# Altium footprint library STM32F407.PcbLib: 54 footprints (part 1 of 4)
Each footprint in its own frame and in the unit in brackets; x right, y up, seen from the top. Pads: shape width x height; smd on the part's side, far side on the other; paste and mask are expansions set on the pad; w line width, h text height; cw(c..) or ccw(c..) is an arc to the next point about the centre after c.
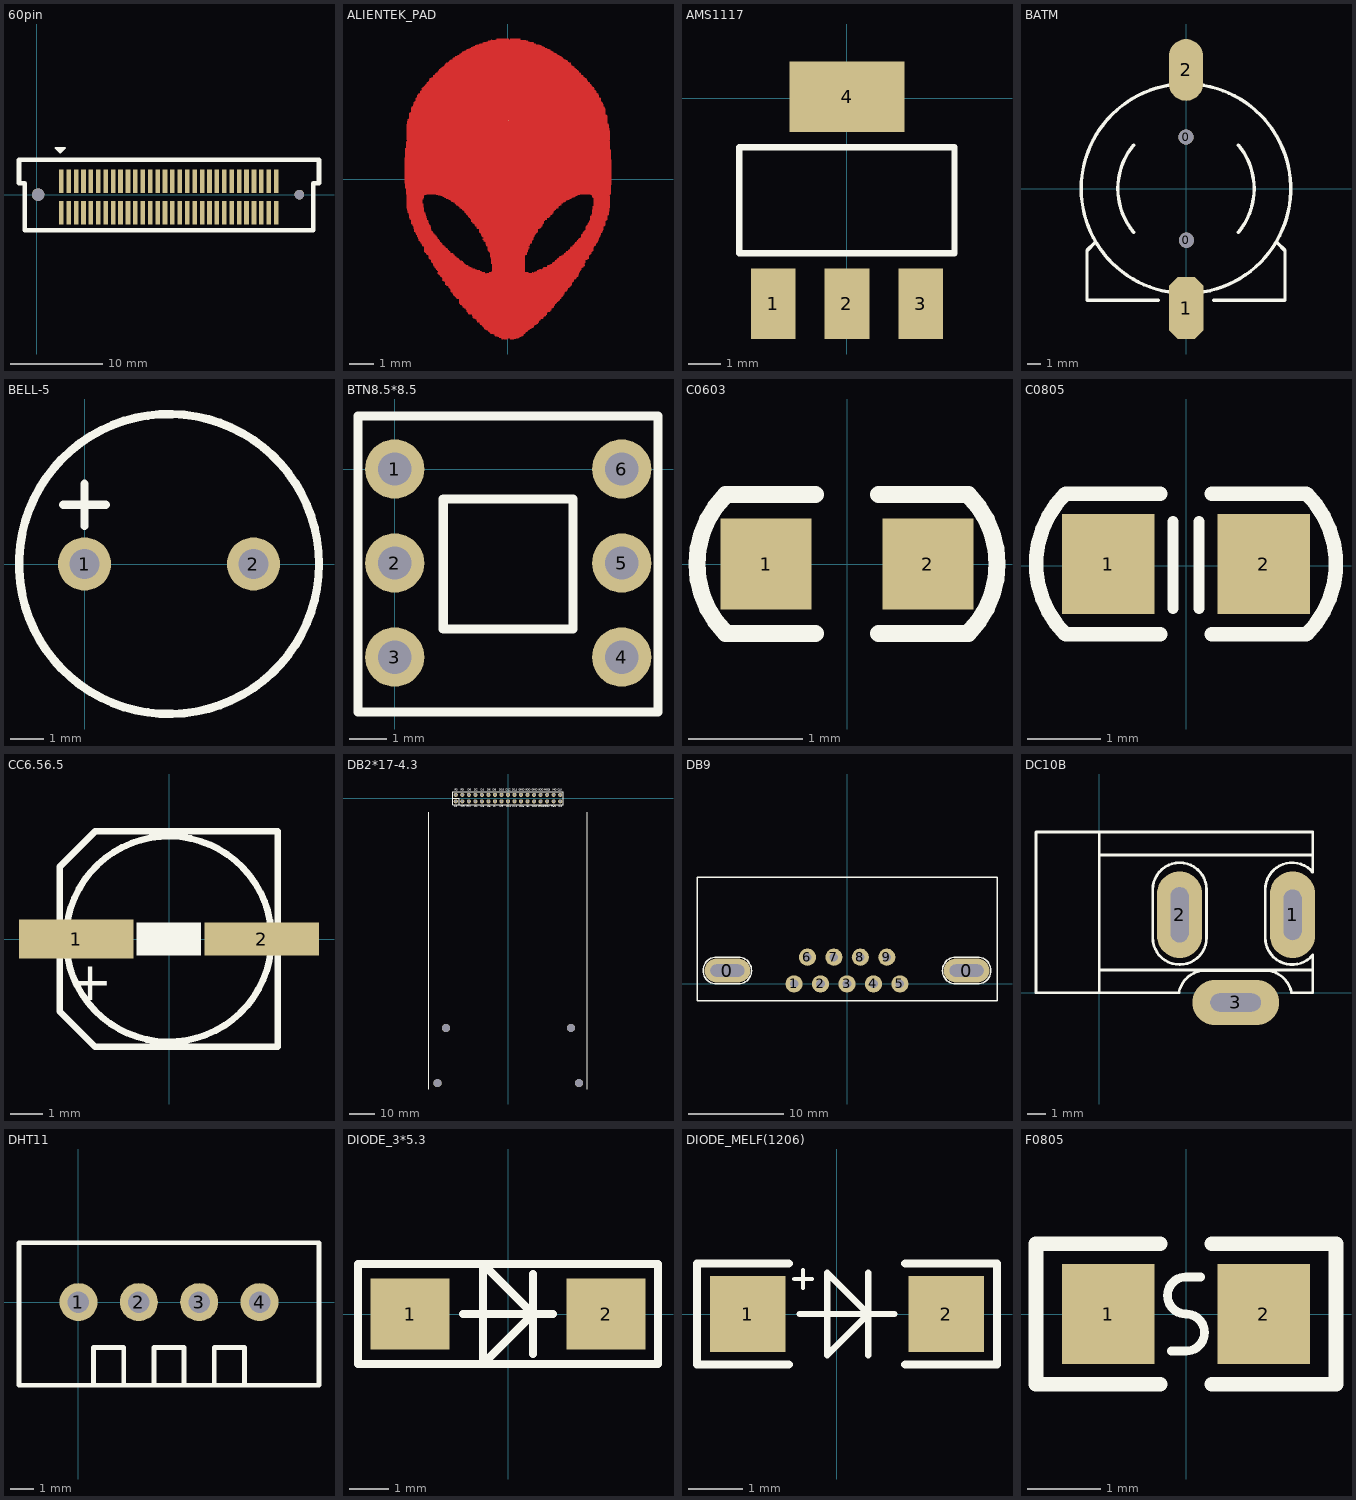
[diagram p0: the footprints below, top view; thin cyan lines are the x and y axes]

## 60pin [mm]
pads (62):
  rect 0.5x2.54 smd: 1(2.657,1.473) 2(3.457,1.473) 3(4.257,1.473) 4(5.057,1.473) 5(5.857,1.473) 6(6.657,1.473) 7(7.457,1.473) 8(8.257,1.473) 9(9.057,1.473) 10(9.857,1.473) 11(10.657,1.473) 12(11.457,1.473) 13(12.257,1.473) 14(13.057,1.473) 15(13.857,1.473) 16(14.657,1.473) 17(15.457,1.473) 18(16.257,1.473) 19(17.057,1.473) 20(17.857,1.473) 21(18.657,1.473) 22(19.457,1.473) 23(20.257,1.473) 24(21.057,1.473) 25(21.857,1.473) 26(22.657,1.473) 27(23.457,1.473) 28(24.257,1.473) 29(25.057,1.473) 30(25.857,1.473) 31(25.857,-1.904) 32(25.057,-1.904) 33(24.257,-1.904) 34(23.457,-1.904) 35(22.657,-1.904) 36(21.857,-1.904) 37(21.057,-1.904) 38(20.257,-1.904) 39(19.457,-1.904) 40(18.657,-1.904) 41(17.857,-1.904) 42(17.057,-1.904) 43(16.257,-1.904) 44(15.457,-1.904) 45(14.657,-1.904) 46(13.857,-1.904) 47(13.057,-1.904) 48(12.257,-1.904) 49(11.457,-1.904) 50(10.657,-1.904) 51(9.857,-1.904) 52(9.057,-1.904) 53(8.257,-1.904) 54(7.457,-1.904) 55(6.657,-1.904) 56(5.857,-1.904) 57(5.057,-1.904) 58(4.257,-1.904) 59(3.457,-1.904) 60(2.657,-1.904)
  round 1.35 hole 1.35: ""(0.157,0.026)
  round 1.05 hole 1.05: ""(28.357,0.026)
Top Overlay:
  lines w0.2: 2.007,5.08 2.54,4.547 3.073,5.08 2.007,5.08
  lines w0.254: 2.68,4.788 2.451,4.788 2.299,4.94 2.807,4.94
  lines w0.5: -1.905,1.27 -1.27,1.27 -1.27,-3.81 29.845,-3.81 29.845,1.27 30.48,1.27 30.48,3.81 27.305,3.81 1.27,3.81 -1.905,3.81 -1.905,1.27

## ALIENTEK_PAD [mil]
pads (1):
  round 1 smd: 1(2,93.76)
Top Layer:
  lines w1.03: -163.73,-5.12 165.18,-5.12 ; -163.73,-4.09 165.18,-4.09 ; -163.73,-3.06 165.18,-3.06 ; -163.73,-2.03 165.18,-2.03 ; -163.73,-1 165.18,-1 ; -163.73,0.03 165.18,0.03 ; -163.73,1.06 165.18,1.06 ; -163.73,2.09 165.18,2.09 ; -163.73,3.12 165.18,3.12 ; -163.73,4.15 165.18,4.15 ; -163.73,5.18 165.18,5.18 ; -163.73,6.21 165.18,6.21 ; -163.73,7.24 165.18,7.24 ; -163.73,8.27 165.18,8.27 ; -163.73,9.3 165.18,9.3 ; -163.73,10.33 165.18,10.33 ; -163.73,11.36 165.18,11.36 ; -163.73,12.39 165.18,12.39 ; -163.73,13.42 165.18,13.42 ; -163.73,14.45 165.18,14.45 ; -163.73,15.48 165.18,15.48 ; -163.73,16.51 165.18,16.51 ; -163.73,17.54 165.18,17.54 ; -163.73,18.57 165.18,18.57 ; -163.73,19.6 165.18,19.6 ; -163.73,20.63 165.18,20.63 ; -163.73,21.66 165.18,21.66 ; -163.73,22.69 165.18,22.69 ; -163.73,23.72 165.18,23.72 ; -163.73,24.75 165.18,24.75 ; -163.73,25.78 165.18,25.78 ; -163.73,26.81 165.18,26.81 ; -163.73,27.84 165.18,27.84 ; -163.73,28.87 165.18,28.87 ; -163.73,29.9 165.18,29.9 ; -163.73,30.93 165.18,30.93 ; -163.73,31.96 164.15,31.96 ; -163.73,32.99 164.15,32.99 ; -163.73,34.02 164.15,34.02 ; -162.7,-13.36 164.15,-13.36 ; -162.7,-12.33 164.15,-12.33 ; -162.7,-11.3 164.15,-11.3 ; -162.7,-10.27 164.15,-10.27 ; -162.7,-9.24 164.15,-9.24 ; -162.7,-8.21 165.18,-8.21 ; -162.7,-7.18 165.18,-7.18 ; -162.7,-6.15 165.18,-6.15 ; -162.7,35.05 164.15,35.05 ; -162.7,36.08 164.15,36.08 ; -162.7,37.11 164.15,37.11 ; -162.7,38.14 164.15,38.14 ; -162.7,39.17 164.15,39.17 ; -162.7,40.2 164.15,40.2 ; -162.7,41.23 164.15,41.23 ; -162.7,42.26 164.15,42.26 ; -162.7,43.29 164.15,43.29 ; -162.7,44.32 164.15,44.32 ; -162.7,45.35 164.15,45.35 ; -162.7,46.38 164.15,46.38 ; -162.7,47.41 164.15,47.41 ; -162.7,48.44 163.12,48.44 ; -162.7,49.47 163.12,49.47 ; -161.67,-22.63 164.15,-22.63 ; -161.67,-21.6 164.15,-21.6 ; -161.67,-20.57 164.15,-20.57 ; -161.67,-19.54 164.15,-19.54 ; -161.67,-18.51 164.15,-18.51 ; -161.67,-17.48 164.15,-17.48 ; -161.67,-16.45 164.15,-16.45 ; -161.67,-15.42 164.15,-15.42 ; -161.67,-14.39 164.15,-14.39 ; -161.67,50.5 163.12,50.5 ; -161.67,51.53 163.12,51.53 ; -161.67,52.56 163.12,52.56 ; -161.67,53.59 163.12,53.59 ; -161.67,54.62 163.12,54.62 ; -161.67,55.65 163.12,55.65 ; -161.67,56.68 163.12,56.68 ; -161.67,57.71 163.12,57.71 ; -161.67,58.74 163.12,58.74 ; -161.67,59.77 163.12,59.77 ; -160.64,-45.29 -133.52,-45.29 ; -160.64,-44.26 -134.55,-44.26 ; -160.64,-43.23 -134.55,-43.23 ; -160.64,-42.2 -134.55,-42.2 ; -160.64,-41.17 -134.55,-41.17 ; -160.64,-40.14 -134.55,-40.14 ; -160.64,-39.11 -134.55,-39.11 ; -160.64,-38.08 -135.58,-38.08 ; -160.64,-37.05 -135.58,-37.05 ; -160.64,-36.02 -135.58,-36.02 ; -160.64,-34.99 -135.58,-34.99 ; -160.64,-33.96 -135.58,-33.96 ; -160.64,-32.93 -135.58,-32.93 ; -160.64,-31.9 -135.58,-31.9 ; -160.64,-30.87 -134.55,-30.87 ; -160.64,-29.84 -134.55,-29.84 ; -160.64,-28.81 -133.52,-28.81 ; -160.64,-27.78 -133.52,-27.78 ; -160.64,-26.75 -133.52,-26.75 ; -160.64,-25.72 -133.52,-25.72 ; -160.64,-24.69 -132.49,-24.69 ; -160.64,-23.66 -129.4,-23.66 ; -160.64,60.8 163.12,60.8 ; -160.64,63.89 163.12,63.89 ; -160.64,64.92 163.12,64.92 ; -160.64,65.95 163.12,65.95 ; -160.64,66.98 163.12,66.98 ; -160.64,68.01 163.12,68.01 ; -160.64,69.04 163.12,69.04 ; -160.64,70.07 163.12,70.07 ; -160.64,71.1 163.12,71.1 ; -160.64,72.13 163.12,72.13 ; -160.64,73.16 163.12,73.16 ; -160.64,74.19 163.12,74.19 ; -160.64,75.22 163.12,75.22 ; -160.64,76.25 163.12,76.25 ; -160.64,77.28 163.12,77.28 ; -160.64,78.31 162.09,78.31 ; -160.64,79.34 2,79.34 162.09,79.34 ; -160.64,80.37 2,80.37 162.09,80.37 ; -160.64,81.4 2,81.4 162.09,81.4 ; -160.64,82.43 2,82.43 161.06,82.43 ; -160.64,83.46 2,83.46 161.06,83.46 ; -160.64,84.49 2,84.49 161.06,84.49 ; -160.64,85.52 2,85.52 161.06,85.52 ; -160.64,86.55 2,86.55 161.06,86.55 ; -160.64,87.58 2,87.58 160.03,87.58 ; -159.61,-48.38 -133.52,-48.38 ; -159.61,-47.35 -133.52,-47.35 ; -159.61,-46.32 -133.52,-46.32 ; -159.61,61.83 162.09,61.83 ; -159.61,62.86 163.12,62.86 ; -159.61,88.61 2,88.61 160.03,88.61 ; -159.61,89.64 2,89.64 159,89.64 ; -159.61,90.67 2,90.67 159,90.67 ; -159.61,91.7 2,91.7 159,91.7 ; -159.61,92.73 2,92.73 159,92.73 ; -158.58,-52.5 -132.49,-52.5 ; -158.58,-51.47 -132.49,-51.47 ; -158.58,-50.44 -133.52,-50.44 ; -158.58,-49.41 -133.52,-49.41 ; -158.58,93.76 2,93.76 159,93.76 ; -158.58,94.79 2,94.79 159,94.79 ; -158.58,95.82 2,95.82 159,95.82 ; -157.55,-54.56 -131.46,-54.56 ; -157.55,-53.53 -131.46,-53.53 ; -157.55,96.85 2,96.85 159,96.85 ; -156.52,-60.74 -129.4,-60.74 ; -156.52,-59.71 -129.4,-59.71 ; -156.52,-58.68 -129.4,-58.68 ; -156.52,-57.65 -130.43,-57.65 ; -156.52,-56.62 -130.43,-56.62 ; -156.52,-55.59 -131.46,-55.59 ; -156.52,97.88 2,97.88 159,97.88 ; -156.52,98.91 2,98.91 159,98.91 ; -156.52,99.94 2,99.94 159,99.94 ; -156.52,100.97 2,100.97 159,100.97 ; -156.52,102 2,102 157.97,102 ; -156.52,103.03 2,103.03 156.94,103.03 ; -156.52,104.06 2,104.06 155.91,104.06 ; -156.52,105.09 2,105.09 155.91,105.09 ; -155.49,-62.8 -128.37,-62.8 ; -155.49,-61.77 -128.37,-61.77 ; -155.49,106.12 2,106.12 155.91,106.12 ; -154.46,-63.83 -128.37,-63.83 ; -154.46,107.15 2,107.15 155.91,107.15 ; -153.43,-70.01 -125.28,-70.01 ; -153.43,-68.98 -126.31,-68.98 ; -153.43,-67.95 -126.31,-67.95 ; -153.43,-66.92 -126.31,-66.92 ; -153.43,-65.89 -126.31,-65.89 ; -153.43,-64.86 -127.34,-64.86 ; -153.43,108.18 2,108.18 155.91,108.18 ; -153.43,109.21 2,109.21 155.91,109.21 ; -153.43,110.24 2,110.24 155.91,110.24 ; -153.43,111.27 2,111.27 155.91,111.27 ; -153.43,112.3 2,112.3 155.91,112.3 ; -153.43,113.33 2,113.33 154.88,113.33 ; -153.43,114.36 2,114.36 154.88,114.36 ; -152.4,-71.04 -125.28,-71.04 ; -152.4,115.39 2,115.39 153.85,115.39 ; -151.37,-73.1 -123.22,-73.1 ; -151.37,-72.07 -124.25,-72.07 ; -151.37,116.42 2,116.42 152.82,116.42 ; -150.34,-74.13 -123.22,-74.13 ; -150.34,117.45 2,117.45 152.82,117.45 ; -150.34,118.48 2,118.48 152.82,118.48 ; -149.31,-78.25 -122.19,-78.25 ; -149.31,-77.22 -123.22,-77.22 ; -149.31,-76.19 -122.19,-76.19 ; -149.31,-75.16 -122.19,-75.16 ; -149.31,119.51 2,119.51 152.82,119.51 ; -149.31,120.54 2,120.54 151.79,120.54 ; -149.31,121.57 2,121.57 151.79,121.57 ; -149.31,122.6 2,122.6 150.76,122.6 ; -148.28,-82.37 -120.13,-82.37 ; -148.28,-81.34 -121.16,-81.34 ; -148.28,-80.31 -121.16,-80.31 ; -148.28,-79.28 -122.19,-79.28 ; -148.28,123.63 2,123.63 149.73,123.63 ; -147.25,-83.4 -119.1,-83.4 ; -147.25,124.66 2,124.66 148.7,124.66 ; -146.22,-85.46 -118.07,-85.46 ; -146.22,-84.43 -119.1,-84.43 ; -146.22,125.69 2,125.69 148.7,125.69 ; -146.22,126.72 2,126.72 148.7,126.72 ; -146.22,127.75 2,127.75 148.7,127.75 ; -146.22,128.78 2,128.78 148.7,128.78 ; -145.19,-87.52 -117.04,-87.52 ; -145.19,-86.49 -117.04,-86.49 ; -145.19,129.81 2,129.81 147.67,129.81 ; -144.16,-90.61 -113.95,-90.61 ; -144.16,-89.58 -113.95,-89.58 ; -144.16,-88.55 -114.98,-88.55 ; -144.16,130.84 2,130.84 145.61,130.84 ; -144.16,131.87 2,131.87 145.61,131.87 ; -144.16,132.9 2,132.9 145.61,132.9 ; -144.16,133.93 2,133.93 145.61,133.93 ; -143.13,-91.64 -112.92,-91.64 ; -143.13,134.96 2,134.96 144.58,134.96 ; -142.1,-93.7 -111.89,-93.7 ; -142.1,-92.67 -111.89,-92.67 ; -142.1,135.99 2,135.99 144.58,135.99 ; -141.07,-96.79 -108.8,-96.79 ; -141.07,-95.76 -109.83,-95.76 ; -141.07,-94.73 -110.86,-94.73 ; -140.04,-97.82 -107.77,-97.82 ; -140.04,137.02 2,137.02 142.52,137.02 ; -139.01,-98.85 -107.77,-98.85 ; -139.01,138.05 2,138.05 141.49,138.05 ; -139.01,139.08 2,139.08 141.49,139.08 ; -139.01,140.11 2,140.11 141.49,140.11 ; -137.98,-100.91 -105.71,-100.91 ; -137.98,-99.88 -106.74,-99.88 ; -137.98,141.14 2,141.14 140.46,141.14 ; -136.95,-102.97 -103.65,-102.97 ; -136.95,-101.94 -104.68,-101.94 ; -136.95,142.17 2,142.17 139.43,142.17 ; -136.95,144.23 2,144.23 138.4,144.23 ; -136.95,145.26 2,145.26 138.4,145.26 ; -135.92,-105.03 -102.62,-105.03 ; -135.92,-104 -103.65,-104 ; -135.92,143.2 2,143.2 138.4,143.2 ; -134.89,-106.06 -100.56,-106.06 ; -134.89,146.29 2,146.29 137.37,146.29 ; -133.86,147.32 2,147.32 135.31,147.32 ; -132.83,-114.3 -92.32,-114.3 ; -132.83,-113.27 -93.35,-113.27 ; -132.83,-112.24 -95.41,-112.24 ; -132.83,-111.21 -95.41,-111.21 ; -132.83,-110.18 -96.44,-110.18 ; -132.83,-109.15 -98.5,-109.15 ; -132.83,-108.12 -99.53,-108.12 ; -132.83,-107.09 -99.53,-107.09 ; -132.83,148.35 2,148.35 135.31,148.35 ; -131.8,-115.33 -91.29,-115.33 ; -131.8,149.38 2,149.38 134.28,149.38 ; -130.77,-116.36 -91.29,-116.36 ; -130.77,150.41 2,150.41 133.25,150.41 ; -129.74,-117.39 -87.17,-117.39 ; -129.74,151.44 2,151.44 132.22,151.44 ; -128.71,-119.45 -86.14,-119.45 ; -128.71,-118.42 -86.14,-118.42 ; -128.71,152.47 2,152.47 131.19,152.47 ; -128.71,153.5 2,153.5 131.19,153.5 ; -127.68,154.53 2,154.53 130.16,154.53 ; -126.65,-120.48 -85.11,-120.48 ; -126.65,155.56 2,155.56 128.1,155.56 ; -125.62,-124.6 -79.96,-124.6 ; -125.62,-123.57 -82.02,-123.57 ; -125.62,-122.54 -83.05,-122.54 ; -125.62,-121.51 -84.08,-121.51 ; -125.62,156.59 2,156.59 128.1,156.59 ; -124.59,-125.63 -78.93,-125.63 ; -124.59,157.62 2,157.62 127.07,157.62 ; -124.59,158.65 2,158.65 126.04,158.65 ; -123.56,-126.66 -77.9,-126.66 ; -123.56,159.68 2,159.68 126.04,159.68 ; -123.56,160.71 2,160.71 125.01,160.71 ; -122.53,-127.69 -76.87,-127.69 ; -121.5,-130.78 -71.72,-130.78 ; -121.5,-129.75 -72.75,-129.75 ; -121.5,-128.72 -75.84,-128.72 ; -121.5,161.74 2,161.74 122.95,161.74 ; -120.47,-131.81 -70.69,-131.81 ; -119.44,-132.84 -69.66,-132.84 ; -119.44,162.77 2,162.77 121.92,162.77 ; -118.41,-135.93 -66.57,-135.93 ; -118.41,-134.9 -67.6,-134.9 ; -118.41,-133.87 -68.63,-133.87 ; -118.41,163.8 2,163.8 120.89,163.8 ; -118.41,164.83 2,164.83 120.89,164.83 ; -118.41,165.86 2,165.86 119.86,165.86 ; -117.38,-137.99 -62.45,-137.99 ; -117.38,-136.96 -63.48,-136.96 ; -116.35,-140.05 -58.33,-140.05 ; -116.35,-139.02 -60.39,-139.02 ; -116.35,166.89 2,166.89 117.8,166.89 ; -115.32,-141.08 -56.27,-141.08 ; -115.32,167.92 2,167.92 116.77,167.92 ; -114.29,168.95 2,168.95 116.77,168.95 ; -113.26,-143.14 -51.12,-143.14 ; -113.26,-142.11 -52.15,-142.11 ; -113.26,-23.66 114.71,-23.66 ; -113.26,169.98 2,169.98 115.74,169.98 ; -112.23,-145.2 -43.91,-145.2 ; -112.23,-144.17 -49.06,-144.17 ; -111.2,-149.32 -35.67,-149.32 ; -111.2,-148.29 -36.7,-148.29 ; -111.2,171.01 2,171.01 113.68,171.01 ; -110.17,-150.35 113.68,-150.35 ; -110.17,-147.26 -40.82,-147.26 ; -110.17,-146.23 -41.85,-146.23 ; -110.17,-24.69 111.62,-24.69 ; -110.17,172.04 2,172.04 113.68,172.04 ; -110.17,173.07 2,173.07 112.65,173.07 ; -109.14,-151.38 112.65,-151.38 ; -109.14,174.1 2,174.1 111.62,174.1 ; -109.14,175.13 2,175.13 110.59,175.13 ; -108.11,-152.41 112.65,-152.41 ; -107.08,-153.44 112.65,-153.44 ; -107.08,176.16 2,176.16 108.53,176.16 ; -106.05,-154.47 111.62,-154.47 ; -106.05,-25.72 110.59,-25.72 ; -106.05,177.19 2,177.19 107.5,177.19 ; -105.02,-155.5 110.59,-155.5 ; -105.02,178.22 2,178.22 106.47,178.22 ; -103.99,-159.62 105.44,-159.62 ; -103.99,-156.53 109.56,-156.53 ; -102.96,-160.65 105.44,-160.65 ; -102.96,-158.59 107.5,-158.59 ; -102.96,-157.56 108.53,-157.56 ; -102.96,-26.75 107.5,-26.75 ; -102.96,179.25 2,179.25 106.47,179.25 ; -101.93,-161.68 105.44,-161.68 ; -101.93,180.28 2,180.28 104.41,180.28 ; -100.9,-27.78 106.47,-27.78 ; -100.9,181.31 2,181.31 103.38,181.31 ; -99.87,-162.71 104.41,-162.71 ; -99.87,-28.81 103.38,-28.81 ; -99.87,182.34 2,182.34 101.32,182.34 ; -98.84,-166.83 102.35,-166.83 ; -98.84,-165.8 102.35,-165.8 ; -98.84,-164.77 102.35,-164.77 ; -98.84,-163.74 103.38,-163.74 ; -98.84,183.37 2,183.37 100.29,183.37 ; -98.84,184.4 2,184.4 100.29,184.4 ; -97.81,-167.86 101.32,-167.86 ; -97.81,-29.84 101.32,-29.84 ; -97.81,185.43 2,185.43 100.29,185.43 ; -96.78,-168.89 101.32,-168.89 ; -94.72,-169.92 100.29,-169.92 ; -94.72,-30.87 99.26,-30.87 ; -94.72,186.46 2,186.46 97.2,186.46 ; -93.69,-171.98 97.2,-171.98 ; -93.69,-170.95 99.26,-170.95 ; -93.69,187.49 2,187.49 96.17,187.49 ; -92.66,-173.01 96.17,-173.01 ; -92.66,-31.9 97.2,-31.9 ; -92.66,188.52 2,188.52 96.17,188.52 ; -91.63,-174.04 96.17,-174.04 ; -91.63,-32.93 95.14,-32.93 ; -91.63,189.55 2,189.55 94.11,189.55 ; -90.6,-178.16 92.05,-178.16 ; -90.6,-177.13 94.11,-177.13 ; -90.6,-176.1 95.14,-176.1 ; -90.6,-175.07 95.14,-175.07 ; -90.6,190.58 2,190.58 93.08,190.58 ; -89.57,-179.19 91.02,-179.19 ; -89.57,-33.96 93.08,-33.96 ; -88.54,-34.99 92.05,-34.99 ; -87.51,-181.25 89.99,-181.25 ; -87.51,-180.22 89.99,-180.22 ; -87.51,191.61 2,191.61 89.99,191.61 ; -87.51,192.64 2,192.64 88.96,192.64 ; -86.48,-183.31 88.96,-183.31 ; -86.48,-182.28 89.99,-182.28 ; -86.48,-36.02 89.99,-36.02 ; -86.48,193.67 2,193.67 87.93,193.67 ; -85.45,-184.34 88.96,-184.34 ; -84.42,-185.37 87.93,-185.37 ; -84.42,-37.05 87.93,-37.05 ; -84.42,194.7 -1,194.7 -0.7,194.7 2,194.7 86.9,194.7 ; -83.39,-186.4 86.9,-186.4 ; -83.39,-38.08 85.87,-38.08 ; -83.39,195.73 -1,195.73 -0.7,195.73 2,195.73 85.87,195.73 ; -82.36,-187.43 85.87,-187.43 ; -82.36,-39.11 85.87,-39.11 ; -81.33,-188.46 85.87,-188.46 ; -81.33,-40.14 85.87,-40.14 ; -80.3,-189.49 84.84,-189.49 ; -80.3,196.76 -1,196.76 -0.7,196.76 2,196.76 82.78,196.76 ; -79.27,-41.17 82.78,-41.17 ; -79.27,197.79 -1,197.79 -0.7,197.79 2,197.79 81.75,197.79 ; -78.24,-42.2 81.75,-42.2 ; -77.21,-196.7 77.63,-196.7 ; -77.21,-195.67 78.66,-195.67 ; -77.21,-194.64 79.69,-194.64 ; -77.21,-193.61 80.72,-193.61 ; -77.21,-191.55 82.78,-191.55 ; -77.21,-190.52 82.78,-190.52 ; -77.21,-43.23 80.72,-43.23 ; -77.21,198.82 -1,198.82 -0.7,198.82 2,198.82 79.69,198.82 ; -76.18,-197.73 76.6,-197.73 ; -76.18,-192.58 81.75,-192.58 ; -76.18,-45.29 80.72,-45.29 ; -76.18,-44.26 80.72,-44.26 ; -76.18,199.85 -1,199.85 -0.7,199.85 2,199.85 78.66,199.85 ; -75.15,-198.76 75.57,-198.76 ; -74.12,-46.32 77.63,-46.32 ; -74.12,200.88 -1,200.88 -0.7,200.88 2,200.88 76.6,200.88 ; -73.09,-199.79 75.57,-199.79 ; -73.09,201.91 -1,201.91 -0.7,201.91 2,201.91 74.54,201.91 ; -72.06,-200.82 74.54,-200.82 ; -72.06,-47.35 76.6,-47.35 ; -72.06,202.94 -1,202.94 -0.7,202.94 2,202.94 72.48,202.94 ; -71.03,-202.88 73.51,-202.88 ; -71.03,-201.85 73.51,-201.85 ; -71.03,-48.38 75.57,-48.38 ; -70,-203.91 72.48,-203.91 ; -70,-49.41 74.54,-49.41 ; -70,203.97 -1,203.97 -0.7,203.97 2,203.97 71.45,203.97 ; -68.97,-204.94 71.45,-204.94 ; -68.97,-50.44 73.51,-50.44 ; -67.94,-52.5 72.48,-52.5 ; -67.94,-51.47 72.48,-51.47 ; -67.94,205 -1,205 -0.7,205 2,205 69.39,205 ; -66.91,-205.97 69.39,-205.97 ; -66.91,-53.53 72.48,-53.53 ; -65.88,-207 68.36,-207 ; -65.88,-54.56 71.45,-54.56 ; -65.88,206.03 -1,206.03 -0.7,206.03 2,206.03 68.36,206.03 ; -64.85,-210.09 67.33,-210.09 ; -64.85,-209.06 68.36,-209.06 ; -64.85,-208.03 69.39,-208.03 ; -64.85,-55.59 70.42,-55.59 ; -63.82,-211.12 64.24,-211.12 ; -63.82,-56.62 68.36,-56.62 ; -63.82,207.06 -1,207.06 -0.7,207.06 2,207.06 66.3,207.06 ; -62.79,-213.18 62.18,-213.18 ; -62.79,-212.15 62.18,-212.15 ; -62.79,-58.68 67.33,-58.68 ; -62.79,-57.65 68.36,-57.65 ; -61.76,-214.21 62.18,-214.21 ; -61.76,-59.71 66.3,-59.71 ; -61.76,208.09 -1,208.09 -0.7,208.09 2,208.09 63.21,208.09 ; -60.73,-60.74 65.27,-60.74 ; -59.7,-61.77 62.18,-61.77 ; -59.7,209.12 -1,209.12 -0.7,209.12 2,209.12 62.18,209.12 ; -58.67,-62.8 62.18,-62.8 ; -57.64,-66.92 58.06,-66.92 ; -57.64,-65.89 58.06,-65.89 ; -57.64,-64.86 59.09,-64.86 ; -57.64,-63.83 62.18,-63.83 ; -57.64,210.15 -1,210.15 -0.7,210.15 2,210.15 59.09,210.15 ; -56.61,-216.27 61.15,-216.27 ; -56.61,-215.24 62.18,-215.24 ; -56.61,-67.95 58.06,-67.95 ; -55.58,-219.36 57.03,-219.36 ; -55.58,-218.33 58.06,-218.33 ; -55.58,-217.3 60.12,-217.3 ; -55.58,-68.98 58.06,-68.98 ; -55.58,211.18 -1,211.18 -0.7,211.18 2,211.18 58.06,211.18 ; -54.55,-220.39 57.03,-220.39 ; -53.52,-70.01 57.03,-70.01 ; -53.52,212.21 -1,212.21 -0.7,212.21 2,212.21 54.97,212.21 ; -52.49,-221.42 56,-221.42 ; -52.49,-72.07 54.97,-72.07 ; -52.49,-71.04 56,-71.04 ; -51.46,-74.13 54.97,-74.13 ; -51.46,-73.1 54.97,-73.1 ; -51.46,213.24 -1,213.24 -0.7,213.24 2,213.24 53.94,213.24 ; -50.43,-222.45 52.91,-222.45 ; -49.4,-224.51 50.85,-224.51 ; -49.4,-223.48 51.88,-223.48 ; -49.4,-77.22 51.88,-77.22 ; -49.4,-76.19 52.91,-76.19 ; -49.4,-75.16 53.94,-75.16 ; -49.4,214.27 -1,214.27 -0.7,214.27 2,214.27 50.85,214.27 ; -48.37,-226.57 49.82,-226.57 ; -48.37,-225.54 49.82,-225.54 ; -48.37,-78.25 50.85,-78.25 ; -45.28,-83.4 47.76,-83.4 ; -45.28,-82.37 47.76,-82.37 ; -45.28,-81.34 47.76,-81.34 ; -45.28,-80.31 47.76,-80.31 ; -45.28,-79.28 47.76,-79.28 ; -45.28,215.3 -1,215.3 -0.7,215.3 2,215.3 2.63,215.3 44.67,215.3 ; -44.25,-229.66 47.76,-229.66 ; -44.25,-228.63 47.76,-228.63 ; -44.25,-227.6 48.79,-227.6 ; -44.25,-84.43 46.73,-84.43 ; -44.25,216.33 -1,216.33 -0.7,216.33 2,216.33 2.63,216.33 44.67,216.33 ; -43.22,-230.69 45.7,-230.69 ; -43.22,-85.46 45.7,-85.46 ; -42.19,-88.55 43.64,-88.55 ; -42.19,-87.52 43.64,-87.52 ; -42.19,-86.49 44.67,-86.49 ; -41.16,-231.72 43.64,-231.72 ; -41.16,-89.58 42.61,-89.58 ; -40.13,-232.75 41.58,-232.75 ; -40.13,-90.61 42.61,-90.61 ; -39.1,-233.78 41.58,-233.78 ; -39.1,-95.76 40.55,-95.76 ; -39.1,-94.73 40.55,-94.73 ; -39.1,-91.64 41.58,-91.64 ; -39.1,217.36 -1,217.36 -0.7,217.36 2,217.36 2.63,217.36 4.36,217.36 41.58,217.36 ; -38.07,-235.84 40.55,-235.84 ; -38.07,-234.81 40.55,-234.81 ; -38.07,-97.82 38.49,-97.82 ; -38.07,-96.79 39.52,-96.79 ; -38.07,-93.7 40.55,-93.7 ; -38.07,-92.67 40.55,-92.67 ; -38.07,218.39 -1,218.39 -0.7,218.39 2,218.39 2.63,218.39 4.36,218.39 40.55,218.39 ; -37.04,-236.87 37.46,-236.87 ; -36.01,-237.9 35.4,-237.9 ; -36.01,-98.85 38.49,-98.85 ; -34.98,-238.93 34.37,-238.93 ; -34.98,-102.97 35.4,-102.97 ; -34.98,-101.94 36.43,-101.94 ; -34.98,-100.91 38.49,-100.91 ; -34.98,-99.88 38.49,-99.88 ; -33.95,-105.03 34.37,-105.03 ; -33.95,-104 35.4,-104 ; -32.92,-239.96 33.34,-239.96 ; -32.92,-149.32 113.68,-149.32 ; -32.92,-106.06 34.37,-106.06 ; -32.92,219.42 -1,219.42 -0.7,219.42 2,219.42 2.63,219.42 4.36,219.42 19,219.42 34.37,219.42 ; -31.89,-112.24 32.31,-112.24 ; -31.89,-111.21 33.34,-111.21 ; -31.89,-110.18 33.34,-110.18 ; -31.89,-108.12 34.37,-108.12 ; -31.89,-107.09 33.34,-107.09 ; -30.86,-240.99 32.31,-240.99 ; -30.86,-113.27 32.31,-113.27 ; -30.86,-109.15 34.37,-109.15 ; -30.86,220.45 -1,220.45 -0.7,220.45 2,220.45 2.63,220.45 4,220.45 ; -29.83,-242.02 30.25,-242.02 ; -29.83,-114.3 32.31,-114.3 ; -28.8,-243.05 29.22,-243.05 ; -28.8,-148.29 33.34,-148.29 ; -28.8,-115.33 31.28,-115.33 ; -27.77,-244.08 28.19,-244.08 ; -27.77,-122.54 27.16,-122.54 ; -27.77,-121.51 27.16,-121.51 ; -27.77,-120.48 28.19,-120.48 ; -27.77,-119.45 30.25,-119.45 ; -27.77,-118.42 30.25,-118.42 ; -27.77,-117.39 30.25,-117.39 ; -27.77,-116.36 30.25,-116.36 ; -26.74,-245.11 27.16,-245.11 ; -26.74,-124.6 27.16,-124.6 ; -26.74,-123.57 27.16,-123.57 ; -26.74,221.48 -1,221.48 -0.7,221.48 2,221.48 2.63,221.48 4,221.48 4.36,221.48 19,221.48 29.22,221.48 ; -25.71,-147.26 27.16,-147.26 ; -25.71,-133.87 27.16,-133.87 ; -25.71,-132.84 27.16,-132.84 ; -25.71,-131.81 27.16,-131.81 ; -25.71,-130.78 27.16,-130.78 ; -25.71,-129.75 27.16,-129.75 ; -25.71,-128.72 27.16,-128.72 ; -25.71,-127.69 27.16,-127.69 ; -25.71,-126.66 27.16,-126.66 ; -25.71,-125.63 27.16,-125.63 ; -25.71,222.51 -25.37,222.51 ; -24.68,-146.23 27.16,-146.23 ; -24.68,-145.2 27.16,-145.2 ; -24.68,-144.17 27.16,-144.17 ; -24.68,-143.14 27.16,-143.14 ; -24.68,-142.11 27.16,-142.11 ; -24.68,-141.08 27.16,-141.08 ; -24.68,-140.05 27.16,-140.05 ; -24.68,-139.02 27.16,-139.02 ; -24.68,-137.99 27.16,-137.99 ; -24.68,-136.96 27.16,-136.96 ; -24.68,-135.93 27.16,-135.93 ; -24.68,-134.9 27.16,-134.9 ; -21.59,-246.14 26.13,-246.14 ; -20.56,-248.2 25.1,-248.2 ; -20.56,-247.17 25.1,-247.17 ; -19.53,-249.23 23.04,-249.23 ; -18.5,222.51 -1,222.51 -0.7,222.51 2,222.51 2.63,222.51 4,222.51 4.36,222.51 19,222.51 19.95,222.51 ; -17.47,223.54 -11,223.54 -1,223.54 -0.7,223.54 2,223.54 ; -15.41,-250.26 20.98,-250.26 ; -13.35,-251.29 18.92,-251.29 ; -10.26,-252.32 16.86,-252.32 ; -9.23,-254.38 -7.86,-254.38 ; -9.23,-253.35 -0.65,-253.35 ; -6.14,-254.38 -0.65,-254.38 ; 4,223.54 4.36,223.54 19,223.54 19.95,223.54 ; 4.16,-254.38 9.65,-254.38 ; 4.16,-253.35 12.74,-253.35 ; 4.36,220.45 19,220.45 32.31,220.45 ; 39.18,-148.29 40.55,-148.29 ; 42.27,-148.29 113.68,-148.29 ; 43.3,-147.26 114.71,-147.26 ; 46.39,-146.23 114.71,-146.23 ; 47.42,-145.2 115.74,-145.2 ; 49.48,-144.17 116.77,-144.17 ; 51.54,-143.14 52.91,-143.14 ; 54.63,-143.14 117.8,-143.14 ; 55.66,-142.11 117.8,-142.11 ; 56.69,-141.08 117.8,-141.08 ; 57.72,-140.05 118.83,-140.05 ; 62.87,-139.02 120.89,-139.02 ; 62.87,-137.99 121.92,-137.99 ; 63.9,-136.96 122.95,-136.96 ; 66.99,-135.93 122.95,-135.93 ; 69.05,-134.9 121.92,-134.9 ; 71.11,-133.87 121.92,-133.87 ; 72.14,-132.84 122.95,-132.84 ; 72.14,-131.81 123.98,-131.81 ; 75.23,-130.78 123.98,-130.78 ; 76.26,-129.75 123.98,-129.75 ; 76.26,-128.72 123.98,-128.72 ; 78.32,-127.69 126.04,-127.69 ; 79.35,-126.66 128.1,-126.66 ; 80.38,-125.63 129.13,-125.63 ; 81.41,-124.6 129.13,-124.6 ; 82.44,-123.57 129.13,-123.57 ; 83.47,-122.54 129.13,-122.54 ; 85.53,-121.51 129.13,-121.51 ; 87.59,-120.48 130.16,-120.48 ; 90.68,-119.45 131.19,-119.45 ; 90.68,-118.42 132.22,-118.42 ; 90.68,-117.39 133.25,-117.39 ; 92.74,-116.36 133.25,-116.36 ; 93.77,-115.33 133.25,-115.33 ; 93.77,-114.3 135.31,-114.3 ; 96.86,-113.27 136.34,-113.27 ; 97.89,-112.24 136.34,-112.24 ; 98.92,-111.21 136.34,-111.21 ; 99.95,-110.18 136.34,-110.18 ; 99.95,-109.15 136.34,-109.15 ; 100.98,-108.12 136.34,-108.12 ; 100.98,-107.09 137.37,-107.09 ; 104.07,-106.06 138.4,-106.06 ; 104.07,-105.03 139.43,-105.03 ; 105.1,-104 140.46,-104 ; 106.13,-102.97 140.46,-102.97 ; 108.19,-101.94 141.49,-101.94 ; 108.19,-100.91 141.49,-100.91 ; 108.19,-99.88 142.52,-99.88 ; 110.25,-98.85 143.55,-98.85 ; 111.28,-97.82 143.55,-97.82 ; 111.28,-96.79 144.58,-96.79 ; 112.31,-95.76 144.58,-95.76 ; 113.34,-94.73 145.61,-94.73 ; 114.37,-93.7 145.61,-93.7 ; 116.43,-92.67 145.61,-92.67 ; 117.46,-91.64 146.64,-91.64 ; 117.46,-90.61 146.64,-90.61 ; 117.46,-89.58 147.67,-89.58 ; 117.46,-88.55 147.67,-88.55 ; 118.49,-87.52 148.7,-87.52 ; 119.52,-86.49 148.7,-86.49 ; 119.52,-85.46 148.7,-85.46 ; 120.55,-84.43 149.73,-84.43 ; 121.58,-83.4 150.76,-83.4 ; 121.58,-82.37 150.76,-82.37 ; 122.61,-81.34 151.79,-81.34 ; 124.67,-80.31 151.79,-80.31 ; 124.67,-79.28 152.82,-79.28 ; 124.67,-78.25 152.82,-78.25 ; 124.67,-77.22 152.82,-77.22 ; 124.67,-76.19 152.82,-76.19 ; 124.67,-75.16 152.82,-75.16 ; 125.7,-74.13 153.85,-74.13 ; 126.73,-73.1 154.88,-73.1 ; 127.76,-72.07 155.91,-72.07 ; 127.76,-71.04 155.91,-71.04 ; 128.79,-70.01 155.91,-70.01 ; 128.79,-68.98 155.91,-68.98 ; 129.82,-67.95 155.91,-67.95 ; 129.82,-66.92 155.91,-66.92 ; 130.85,-65.89 155.91,-65.89 ; 130.85,-64.86 156.94,-64.86 ; 131.88,-63.83 159,-63.83 ; 131.88,-62.8 159,-62.8 ; 131.88,-61.77 159,-61.77 ; 131.88,-60.74 159,-60.74 ; 131.88,-59.71 159,-59.71 ; 131.88,-58.68 159,-58.68 ; 132.91,-57.65 159,-57.65 ; 132.91,-23.66 163.12,-23.66 ; 133.94,-56.62 160.03,-56.62 ; 133.94,-55.59 161.06,-55.59 ; 133.94,-24.69 163.12,-24.69 ; 134.97,-54.56 161.06,-54.56 ; 134.97,-53.53 161.06,-53.53 ; 134.97,-51.47 161.06,-51.47 ; 134.97,-50.44 162.09,-50.44 ; 134.97,-49.41 162.09,-49.41 ; 134.97,-48.38 162.09,-48.38 ; 134.97,-26.75 163.12,-26.75 ; 134.97,-25.72 162.09,-25.72 ; 136,-52.5 161.06,-52.5 ; 136,-47.35 162.09,-47.35 ; 136,-46.32 162.09,-46.32 ; 136,-45.29 162.09,-45.29 ; 136,-44.26 163.12,-44.26 ; 136,-43.23 163.12,-43.23 ; 136,-28.81 163.12,-28.81 ; 136,-27.78 163.12,-27.78 ; 137.03,-42.2 163.12,-42.2 ; 137.03,-41.17 163.12,-41.17 ; 137.03,-40.14 163.12,-40.14 ; 137.03,-39.11 163.12,-39.11 ; 137.03,-38.08 163.12,-38.08 ; 137.03,-37.05 163.12,-37.05 ; 137.03,-36.02 163.12,-36.02 ; 137.03,-34.99 163.12,-34.99 ; 137.03,-33.96 163.12,-33.96 ; 137.03,-32.93 163.12,-32.93 ; 137.03,-31.9 163.12,-31.9 ; 137.03,-30.87 163.12,-30.87 ; 137.03,-29.84 163.12,-29.84

## AMS1117 [mm]
pads (4):
  rect 1.4x2.2 smd: 1(-2.3,-6.399) 2(0,-6.399) 3(2.3,-6.399)
  rect 3.6x2.2 smd: 4(0,0.052)
Top Overlay:
  lines w0.2: -3.353,-4.826 3.35,-4.826 3.35,-1.524 -3.353,-1.524 -3.353,-4.826
3D body "SW3DPS-SOT-223-DEFAULT.STEP": height 1.65, standoff -0.03, extent -3.251,-6.628 3.249,0.332

## BATM [mm]
pads (4):
  round 1.1 hole 1.1 unplated: 0(0,3.748) 0(0.025,-3.752)
  oct 2.5x4.5 smd: 1(0.025,-8.687)
  oval 2.5x4.5 smd: 2(0,8.636)
Top Overlay:
  lines w0.25: -6.6,-3.902 -7.2,-4.502 -7.2,-8.128 -2,-8.128 ; -3.815,-3.171 cw(c0,-0.002) -3.812,3.171 ; -0.833,-7.576 cw(c0,-0.002) -7.62,-0.002 cw(c0,-0.002) -0.833,7.573 ; 0.833,-7.576 ccw(c0,-0.002) 0.833,7.573 ; 2,-8.128 7.2,-8.128 7.2,-4.502 6.625,-3.927 ; 3.81,-3.177 ccw(c0,-0.002) 3.812,3.171
3D body "User Library-cr1220.STEP": height 4.44, standoff -0.5, extent -7.493,-9.504 7.504,8.996

## BELL-5 [mm]
pads (2):
  round 1.6 hole 0.9: 1(0,0) 2(5.08,0)
Top Overlay:
  circle w0.254: c2.54,0 r4.51
  lines w0.254: -0.635,1.778 0.635,1.778 ; 0,1.143 0,2.413

## BTN8.5*8.5 [mm]
pads (6):
  round 1.6 hole 0.9: 1(0,0) 2(0,-2.54) 3(0,-5.08) 4(6.131,-5.08) 5(6.131,-2.54) 6(6.131,0)
Top Overlay:
  lines w0.25: -0.991,-6.565 -0.991,1.435 7.112,1.435 7.112,-6.565 -0.991,-6.565 ; 1.313,-4.318 4.818,-4.318 4.818,-0.813 1.313,-0.813 1.313,-4.318
3D body "User Library-PSM1-0-0.step": height 13.5, standoff -3.5, extent -0.935,-6.565 7.065,1.435

## C0603 [mm]
pads (2):
  rect 0.8x0.8 smd: 1(-0.711,0) 2(0.711,0)
Top Overlay:
  lines w0.15: -0.279,-0.61 -1.067,-0.61 cw(c-0.457,0) -1.067,0.61 -0.279,0.61 ; 0.279,-0.61 1.067,-0.61 ccw(c0.457,0) 1.067,0.61 0.279,0.61
3D body "0603_C.step": height 0.88, standoff 0, extent -0.8,-0.406 0.8,0.404

## C0805 [mil]
pads (2):
  rect 50x54 smd: 1(-42,1) 2(42,1)
Top Overlay:
  lines w5.91: -7,-23 -7,24 ; 7,-23 7,24
  lines w7.87: -14,-37 -65,-37 cw(c-27.91,1) -65,39 -14,39 ; 14,-37 65,-37 ccw(c27.91,1) 65,39 14,39
3D body "C0805.STEP": height 19.68, standoff 0, extent -39,-24 39.74,25.21

## CC6.56.5 [mm]
pads (2):
  rect 3.5x1.2 smd: 1(-2.845,0)
  rect 3.5x1 smd: 2(2.845,0)
Top Overlay:
  rectangle: -0.997,-0.496 0.987,0.5
  lines w0.2: -3.353,-2.21 -3.353,2.21 -2.254,3.309 3.327,3.309 3.327,-3.305 -2.257,-3.305 -3.353,-2.21
  lines w0.203: 2.924,1.156 ccw(c-0.007,0.002) 2.924,1.154
  text "+" at -1.727,-1.88 h1.2
3D body "SL-E.step": height 5.2, standoff 0, extent -3.5,-3.3 3.5,3.3

## DB2*17-4.3 [mm]
pads (38):
  round 1.6 hole 0.9: 1(-20.322,-1.264) 2(-20.322,1.276) 3(-17.782,-1.264) 4(-17.782,1.276) 5(-15.24,-1.27) 6(-15.242,1.276) 7(-12.7,-1.27) 8(-12.7,1.27) 9(-10.162,-1.264) 10(-10.162,1.276) 11(-7.622,-1.264) 12(-7.622,1.276) 13(-5.082,-1.264) 14(-5.082,1.276) 15(-2.542,-1.264) 16(-2.542,1.276) 17(-0.002,-1.264) 18(-0.002,1.276) 19(2.538,-1.264) 20(2.538,1.276) 21(5.078,-1.264) 22(5.078,1.276) 23(7.618,-1.264) 24(7.618,1.276) 25(10.158,-1.264) 26(10.158,1.276) 27(12.698,-1.264) 28(12.698,1.276) 29(15.238,-1.264) 30(15.238,1.276) 31(17.778,-1.264) 32(17.778,1.276) 33(20.318,-1.264) 34(20.318,1.276)
  round 3.2 hole 3.2: ""(-27.445,-110.866) ""(-24.13,-89.45) ""(24.5,-89.39) ""(27.605,-110.866)
Top Overlay:
  lines w0.203: -21.59,0 -19.05,0 -19.05,-2.5 -19,-2.55 -21.59,-2.55 -21.59,2.55 21.59,2.55 21.59,-2.53 ; -19.11,-2.55 21.59,-2.55
  lines w0.254: -30.861,-113.157 -30.861,-5.588 ; 30.861,-113.157 30.861,-5.588
  text "D14" at 1.703,2.836 h0.71
  text "D7" at -5.717,-3.55 h0.71
  text "RS" at -20.797,2.836 h0.71
  text "CS" at -20.83,-3.55 h0.71
  text "WR" at -18.29,-3.55 h0.71
  text "RST" at -16.131,-3.55 h0.71
  text "D1" at -13.083,-3.55 h0.71
  text "D2" at -13.172,2.836 h0.71
  text "D3" at -10.67,-3.55 h0.71
  text "D4" at -10.672,2.836 h0.71
  text "D5" at -8.13,-3.55 h0.71
  text "D6" at -8.047,2.836 h0.71
  text "D8" at -5.922,2.836 h0.71
  text "D9" at -3.177,-3.55 h0.71
  text "D12" at -0.797,2.836 h0.71
  text "D15" at 4.316,-3.55 h0.71
  text "VDD" at 9.269,-3.55 h0.71
  text "VDD" at 11.828,2.836 h0.71
  text "GND" at 9.203,2.836 h0.71
  text "VDD" at 6.703,2.836 h0.71
  text "D10" at -3.422,2.836 h0.71
  text "D0" at -15.672,2.836 h0.71
  text "RD" at -18.297,2.836 h0.71
  text "GND" at 4.203,2.836 h0.71
  text "GND" at 11.682,-3.55 h0.71
  text "D11" at -0.764,-3.55 h0.71
  text "PEN" at 16.889,-3.55 h0.71
  text "CLK" at 19.328,2.836 h0.71
  text "MOSI" at 14.078,2.836 h0.71
  text "MO" at 17.328,2.836 h0.71
  text "TCS" at 19.429,-3.55 h0.71
  text "MISO" at 13.968,-3.55 h0.71
  text "BL" at 7.237,-3.55 h0.71
  text "D14" at 1.705,2.83 h0.71
  text "D7" at -5.715,-3.556 h0.71
  text "RS" at -20.795,2.83 h0.71
  text "CS" at -20.828,-3.556 h0.71
  text "WR" at -18.288,-3.556 h0.71
  text "RST" at -16.129,-3.556 h0.71
  text "D1" at -13.081,-3.556 h0.71
  text "D2" at -13.17,2.83 h0.71
  text "D3" at -10.668,-3.556 h0.71
  text "D4" at -10.67,2.83 h0.71
  text "D5" at -8.128,-3.556 h0.71
  text "D6" at -8.045,2.83 h0.71
  text "D8" at -5.92,2.83 h0.71
  text "D9" at -3.175,-3.556 h0.71
  text "D13" at 1.705,-3.566 h0.71
  text "D12" at -0.795,2.83 h0.71
  text "D15" at 4.318,-3.556 h0.71
  text "VDD" at 9.271,-3.556 h0.71
  text "VDD" at 11.83,2.83 h0.71
  text "GND" at 9.205,2.83 h0.71
  text "VDD" at 6.705,2.83 h0.71
  text "D10" at -3.42,2.83 h0.71
  text "D0" at -15.67,2.83 h0.71
  text "RD" at -18.295,2.83 h0.71
  text "GND" at 4.205,2.83 h0.71
  text "GND" at 11.684,-3.556 h0.71
  text "D11" at -0.762,-3.556 h0.71
  text "PEN" at 16.891,-3.556 h0.71
  text "CLK" at 19.33,2.83 h0.71
  text "MOSI" at 14.08,2.83 h0.71
  text "MO" at 17.33,2.83 h0.71
  text "TCS" at 19.431,-3.556 h0.71
  text "MISO" at 13.97,-3.556 h0.71
  text "BL" at 7.239,-3.556 h0.71
3D body "User Library-BL1-010-S842-55.step": height 8.42, standoff -3.2, extent -4.062,-2.534 21.838,0.006
3D body "User Library-BL1-010-S842-55.step": height 8.42, standoff -3.2, extent -4.062,0.006 21.838,2.546
3D body "User Library-BL1-010-S842-55.step": height 8.42, standoff -3.2, extent -21.842,-2.534 4.058,0.006
3D body "User Library-BL1-010-S842-55.step": height 8.42, standoff -3.2, extent -21.842,0.006 4.058,2.546

## DB9 [mm]
pads (11):
  oval 4.8x2.5 hole 1.27 slot 3.556 at 0 deg: 0(-12.522,1.397) 0(12.522,1.397)
  round 1.8 hole 0.9: 1(-5.537,0) 2(-2.769,0) 3(0,0) 4(2.769,0) 5(5.537,0) 6(-4.14,2.794) 7(-1.372,2.794) 8(1.397,2.794) 9(4.166,2.794)
Top Overlay:
  lines w0.152: -15.697,-1.778 15.697,-1.778 15.697,11.176 -15.697,11.176 -15.697,-1.778 ; -13.665,0 cw(c-13.665,1.397) -13.665,2.794 -11.379,2.794 cw(c-11.379,1.397) -11.379,0 -13.665,0 ; 11.379,0 cw(c11.379,1.397) 11.379,2.794 13.665,2.794 cw(c13.665,1.397) 13.665,0 11.379,0
3D body "User Library-DRB-9FA.STEP": height 12.6, standoff -4, extent -15.374,-1.555 15.426,16.345

## DC10B [mm]
pads (3):
  oval 2.5x4.8 hole 1 slot 2.794 at 90 deg: 1(10.693,4.318)
  oval 2.5x4.8 hole 1 slot 3.048 at 90 deg: 2(4.445,4.318)
  oval 4.8x2.5 hole 1 slot 2.794 at 0 deg: 3(7.544,-0.533)
Top Overlay:
  lines w0.152: 0,1.27 11.811,1.27 ; 0,7.62 11.687,7.62 11.792,7.62 ; 0.127,8.89 -0.381,8.89 -3.5,8.89 -3.5,0 0,0 ; 4.293,0 0,0 ; 4.403,0.004 cw(c5.867,-0.254) 5.867,1.232 9.169,1.232 cw(c9.169,-0.254) 10.633,0.004 ; 10.668,0 11.811,0 11.811,2.032 ; 11.807,2.093 cw(c10.668,3.048) 9.182,3.048 9.181,5.715 cw(c10.668,5.715) 11.807,6.67 11.811,8.89 0,8.89 0,0 ; 5.931,5.715 ccw(c4.445,5.715) 2.959,5.715 2.958,3.048 ccw(c4.445,3.048) 5.931,3.048 5.931,5.715 ; 5.931,5.715 5.932,5.715
3D body "User Library-dc range - dc connector[4840_2201].STEP": height 11.02, standoff -3.48, extent -3.038,-0.685 10.788,8.821

## DHT11 [mm]
pads (4):
  round 1.6 hole 0.9: 1(0,0) 2(2.54,0) 3(5.08,0) 4(7.62,0)
Top Overlay:
  lines w0.203: -2.5,-3.5 7.62,-3.5 10.12,-3.5 ; -2.5,-3.46 -2.5,0 -2.5,2.5 7.62,2.5 10.12,2.5 10.12,0 10.12,-3.46 ; 0.635,-3.5 0.635,-1.905 1.905,-1.905 1.905,-3.5 ; 3.175,-3.5 3.175,-1.905 4.445,-1.905 4.445,-3.5 ; 5.715,-3.5 5.715,-1.905 6.985,-1.905 6.985,-3.5
3D body "4pin-2.5.step": height 7, standoff -3.4, extent -2.466,-3.383 9.934,2.367

## DIODE_3*5.3 [mm]
pads (2):
  rect 2x1.8 smd: 1(-2.489,0) 2(2.489,0)
Top Overlay:
  lines w0.2: -1.143,0 -0.635,0 1.143,0 ; 0.508,0 0.508,-0.127 -0.635,-1.27 -0.635,1.27 0.508,0.127 ; 0.635,-1.016 0.635,1.016 ; -3.81,-1.27 -3.81,1.27 3.81,1.27 3.81,-1.27 -3.81,-1.27
3D body: height 1.52, standoff 0, extent -2.386,-1.116 2.386,1.116

## DIODE_MELF(1206) [mm]
pads (2):
  rect 1.4x1.4 smd: 1(-1.651,0) 2(2.032,0)
Top Overlay:
  lines w0.076: -0.787,0.648 -0.457,0.648 ; -0.622,0.483 -0.622,0.813
  lines w0.12: -0.686,0 1.067,0 ; 0.584,-0.762 0.584,0.762 ; -0.178,-0.762 0.584,0 -0.178,0.762 -0.178,-0.762
  lines w0.15: -0.889,-0.94 -2.591,-0.94 -2.591,0.94 -0.889,0.94 ; 1.27,-0.94 2.972,-0.94 2.972,0.94 1.27,0.94
3D body "Diode MELF.STEP": height 1.51, standoff 0.01, extent -1.496,-0.75 2.004,0.75

## F0805 [mil]
pads (2):
  rect 50x54 smd: 1(-42,0) 2(42,0)
Top Overlay:
  lines w4.72: -8,-20 0,-20 ccw(c0,-10) 10,-10 ccw(c0,-10) 0,0 cw(c0,10) -10,10 cw(c0,10) 0,20 8,20
  lines w7.87: -14,-38 -81,-38 -81,38 -14,38 ; 14,-38 81,-38 81,38 14,38
3D body "User Library-RES_2013-0805.STEP": height 29.92, standoff 0, extent -45.27,-26.57 45.28,26.58